# Altium footprint library COOP4403_V2.PcbLib: 26 footprints (part 2 of 2)
Each footprint in its own frame and in the unit in brackets; x right, y up, seen from the top. Pads: shape width x height; smd on the part's side, far side on the other; paste and mask are expansions set on the pad; w line width, h text height; cw(c..) or ccw(c..) is an arc to the next point about the centre after c.
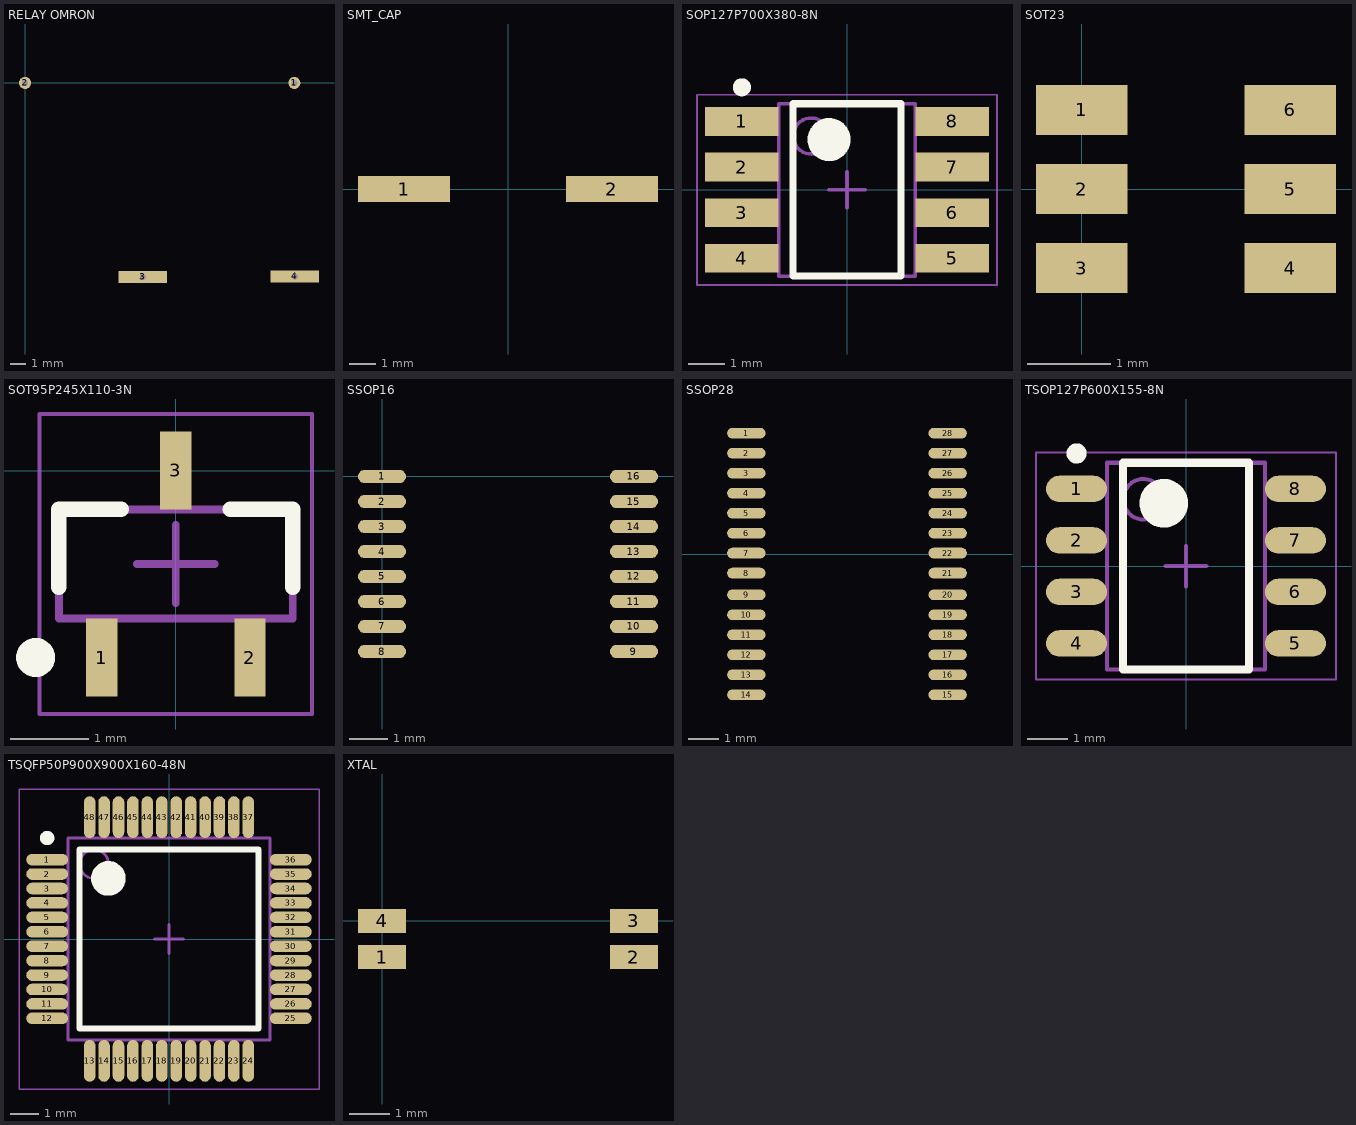
[diagram p1: the footprints below, top view; thin cyan lines are the x and y axes]

## RELAY OMRON [mm]
pads (4):
  round 0.8 hole 0.4: 1(17.78,0) 2(0,0)
  rect 3.2x0.8 hole 0.4 square: 3(7.772,-12.802) 4(17.805,-12.776)
3D body "g5ca-1a-e_5dc.stp": height 11, standoff -3.5, extent -2.009,-14.426 19.991,1.574

## SMT_CAP [mm]
pads (2):
  rect 3.5x1 smd: 1(-3.95,0) 2(3.95,0)
3D body "User Library-CL_series_size10x13,5.STEP": height 13.5, standoff 0, extent -5.438,-5.201 5.462,5.099

## SOP127P700X380-8N [mm] "SOP, 8-Leads, Body 4.80x3.80mm, Pitch 1.27mm, IPC Medium Density"
height 3.8
pads (8):
  rect 2.05x0.8 smd: 1(-2.925,1.905) 2(-2.925,0.635) 3(-2.925,-0.635) 4(-2.925,-1.905) 5(2.925,-1.905) 6(2.925,-0.635) 7(2.925,0.635) 8(2.925,1.905)
Top Overlay:
  circle w0.6: c-0.5,1.4 r0.3
  circle w0.25: c-2.925,2.855 r0.125
  lines w0.2: -1.5,-2.4 1.5,-2.4 1.5,2.4 -1.5,2.4 -1.5,-2.4
Mechanical 13:
  circle w0.1: c-1,1.5 r0.5
  lines w0.1: -1.9,-2.4 1.9,-2.4 1.9,2.4 -1.9,2.4 -1.9,-2.4
Mechanical 15:
  lines w0.05: -4.175,-2.65 4.175,-2.65 4.175,2.65 -4.175,2.65 -4.175,-2.65
  lines w0.1: -0.5,0 0.5,0 ; 0,-0.5 0,0.5
3D body: height 3.8, standoff 0.1, extent -1.9,-2.4 1.9,2.4

## SOT23 [mm]
pads (6):
  rect 1.1x0.6 smd: 1(0,0.95) 2(0,0) 3(0,-0.95) 4(2.5,-0.95) 5(2.5,0) 6(2.5,0.95)
3D body "SW3dPS-SOT23-6-1.STEP": height 1.09, standoff 0, extent -0.019,-1.397 2.407,1.397

## SOT95P245X110-3N [mm] "SOT23, 3-Leads, Body 2.90x2.45mm, Pitch 0.95mm, IPC Medium Density"
height 1.1
pads (3):
  rect 0.4x1 smd: 1(-0.95,-2.394) 2(0.95,-2.394) 3(0,0.006)
Top Overlay:
  circle w0.25: c-1.8,-2.394 r0.125
  lines w0.2: -1.5,-1.494 -1.5,-0.494 -0.7,-0.494 ; 0.7,-0.494 1.5,-0.494 1.5,-1.494
Mechanical 13:
  lines w0.1: -1.5,-1.894 -1.5,-0.494 1.5,-0.494 1.5,-1.894 -1.5,-1.894
Mechanical 15:
  lines w0.05: -1.75,-3.119 -1.75,0.731 1.75,0.731 1.75,-3.119 -1.75,-3.119
  lines w0.1: -0.5,-1.194 0.5,-1.194 ; 0,-1.694 0,-0.694
3D body: height 1.1, standoff 0.05, extent -1.5,-1.894 1.5,-0.494

## SSOP16 [mm]
pads (16):
  oval 1.25x0.35 smd: 1(0,0) 2(0,-0.65) 3(0,-1.3) 4(0,-1.95) 5(0,-2.6) 6(0,-3.25) 7(0,-3.9) 8(0,-4.55) 9(6.55,-4.55) 10(6.55,-3.9) 11(6.55,-3.25) 12(6.55,-2.6) 13(6.55,-1.95) 14(6.55,-1.3) 15(6.55,-0.65) 16(6.55,0)

## SSOP28 [mm]
pads (28):
  oval 1.25x0.35 smd: 1(65.938,3.937) 2(65.938,3.287) 3(65.938,2.637) 4(65.938,1.987) 5(65.938,1.337) 6(65.938,0.687) 7(65.938,0.037) 8(65.938,-0.613) 9(65.938,-1.321) 10(65.938,-1.971) 11(65.938,-2.621) 12(65.938,-3.271) 13(65.938,-3.921) 14(65.938,-4.571) 15(72.488,-4.571) 16(72.488,-3.921) 17(72.488,-3.271) 18(72.488,-2.621) 19(72.488,-1.971) 20(72.488,-1.321) 21(72.488,-0.613) 22(72.488,0.037) 23(72.488,0.687) 24(72.488,1.337) 25(72.488,1.987) 26(72.488,2.637) 27(72.488,3.287) 28(72.488,3.937)
3D body "User Library-SSOP-28-FT232RL.STEP": height 2.16, standoff 0, extent 65.312,-5.47 73.068,4.86

## TSOP127P600X155-8N [mm] "TSOP, 8-Leads, Body 5.05x3.90mm, Pitch 1.27mm, IPC Medium Density"
height 1.55
pads (8):
  oval 1.5x0.65 smd: 1(-2.7,1.905) 2(-2.7,0.635) 3(-2.7,-0.635) 4(-2.7,-1.905) 5(2.7,-1.905) 6(2.7,-0.635) 7(2.7,0.635) 8(2.7,1.905)
Top Overlay:
  circle w0.25: c-2.7,2.78 r0.125
  circle w0.6: c-0.55,1.55 r0.3
  lines w0.2: -1.55,-2.55 -1.55,2.55 1.55,2.55 1.55,-2.55 -1.55,-2.55
Mechanical 13:
  circle w0.1: c-1.05,1.65 r0.5
  lines w0.1: -1.95,-2.55 -1.95,2.55 1.95,2.55 1.95,-2.55 -1.95,-2.55
Mechanical 15:
  lines w0.05: -3.7,-2.8 -3.7,2.8 3.7,2.8 3.7,-2.8 -3.7,-2.8
  lines w0.1: -0.5,0 0.5,0 ; 0,-0.5 0,0.5
3D body: height 1.55, standoff 0.15, extent -1.95,-2.55 1.95,2.55

## TSQFP50P900X900X160-48N [mm] "TSQFP, 48-Leads, Body 7.00x7.00mm, Pitch 0.50mm, IPC Medium Density"
height 1.6
pads (48):
  oval 1.45x0.4 smd: 1(-4.225,2.75) 2(-4.225,2.25) 3(-4.225,1.75) 4(-4.225,1.25) 5(-4.225,0.75) 6(-4.225,0.25) 7(-4.225,-0.25) 8(-4.225,-0.75) 9(-4.225,-1.25) 10(-4.225,-1.75) 11(-4.225,-2.25) 12(-4.225,-2.75) 25(4.225,-2.75) 26(4.225,-2.25) 27(4.225,-1.75) 28(4.225,-1.25) 29(4.225,-0.75) 30(4.225,-0.25) 31(4.225,0.25) 32(4.225,0.75) 33(4.225,1.25) 34(4.225,1.75) 35(4.225,2.25) 36(4.225,2.75)
  oval 0.4x1.45 smd: 13(-2.75,-4.225) 14(-2.25,-4.225) 15(-1.75,-4.225) 16(-1.25,-4.225) 17(-0.75,-4.225) 18(-0.25,-4.225) 19(0.25,-4.225) 20(0.75,-4.225) 21(1.25,-4.225) 22(1.75,-4.225) 23(2.25,-4.225) 24(2.75,-4.225) 37(2.75,4.225) 38(2.25,4.225) 39(1.75,4.225) 40(1.25,4.225) 41(0.75,4.225) 42(0.25,4.225) 43(-0.25,4.225) 44(-0.75,4.225) 45(-1.25,4.225) 46(-1.75,4.225) 47(-2.25,4.225) 48(-2.75,4.225)
Top Overlay:
  circle w0.25: c-4.225,3.5 r0.125
  circle w0.6: c-2.1,2.1 r0.3
  lines w0.2: -3.1,-3.1 -3.1,3.1 3.1,3.1 3.1,-3.1 -3.1,-3.1
Mechanical 13:
  circle w0.1: c-2.6,2.6 r0.5
  lines w0.1: -3.5,-3.5 -3.5,3.5 3.5,3.5 3.5,-3.5 -3.5,-3.5
Mechanical 15:
  lines w0.05: -5.2,-5.2 -5.2,5.2 5.2,5.2 5.2,-5.2 -5.2,-5.2
  lines w0.1: -0.5,0 0.5,0 ; 0,-0.5 0,0.5
3D body: height 1.6, standoff 0.1, extent -3.5,-3.5 3.5,3.5

## XTAL [mm]
pads (4):
  rect 1.2x0.6 smd: 1(0,-0.9) 2(6.3,-0.9) 3(6.3,0) 4(0,0)